# Altium footprint library DaughterBoard.PcbLib: 103 footprints (part 4 of 7)
Each footprint in its own frame and in the unit in brackets; x right, y up, seen from the top. Pads: shape width x height; smd on the part's side, far side on the other; paste and mask are expansions set on the pad; w line width, h text height; cw(c..) or ccw(c..) is an arc to the next point about the centre after c.
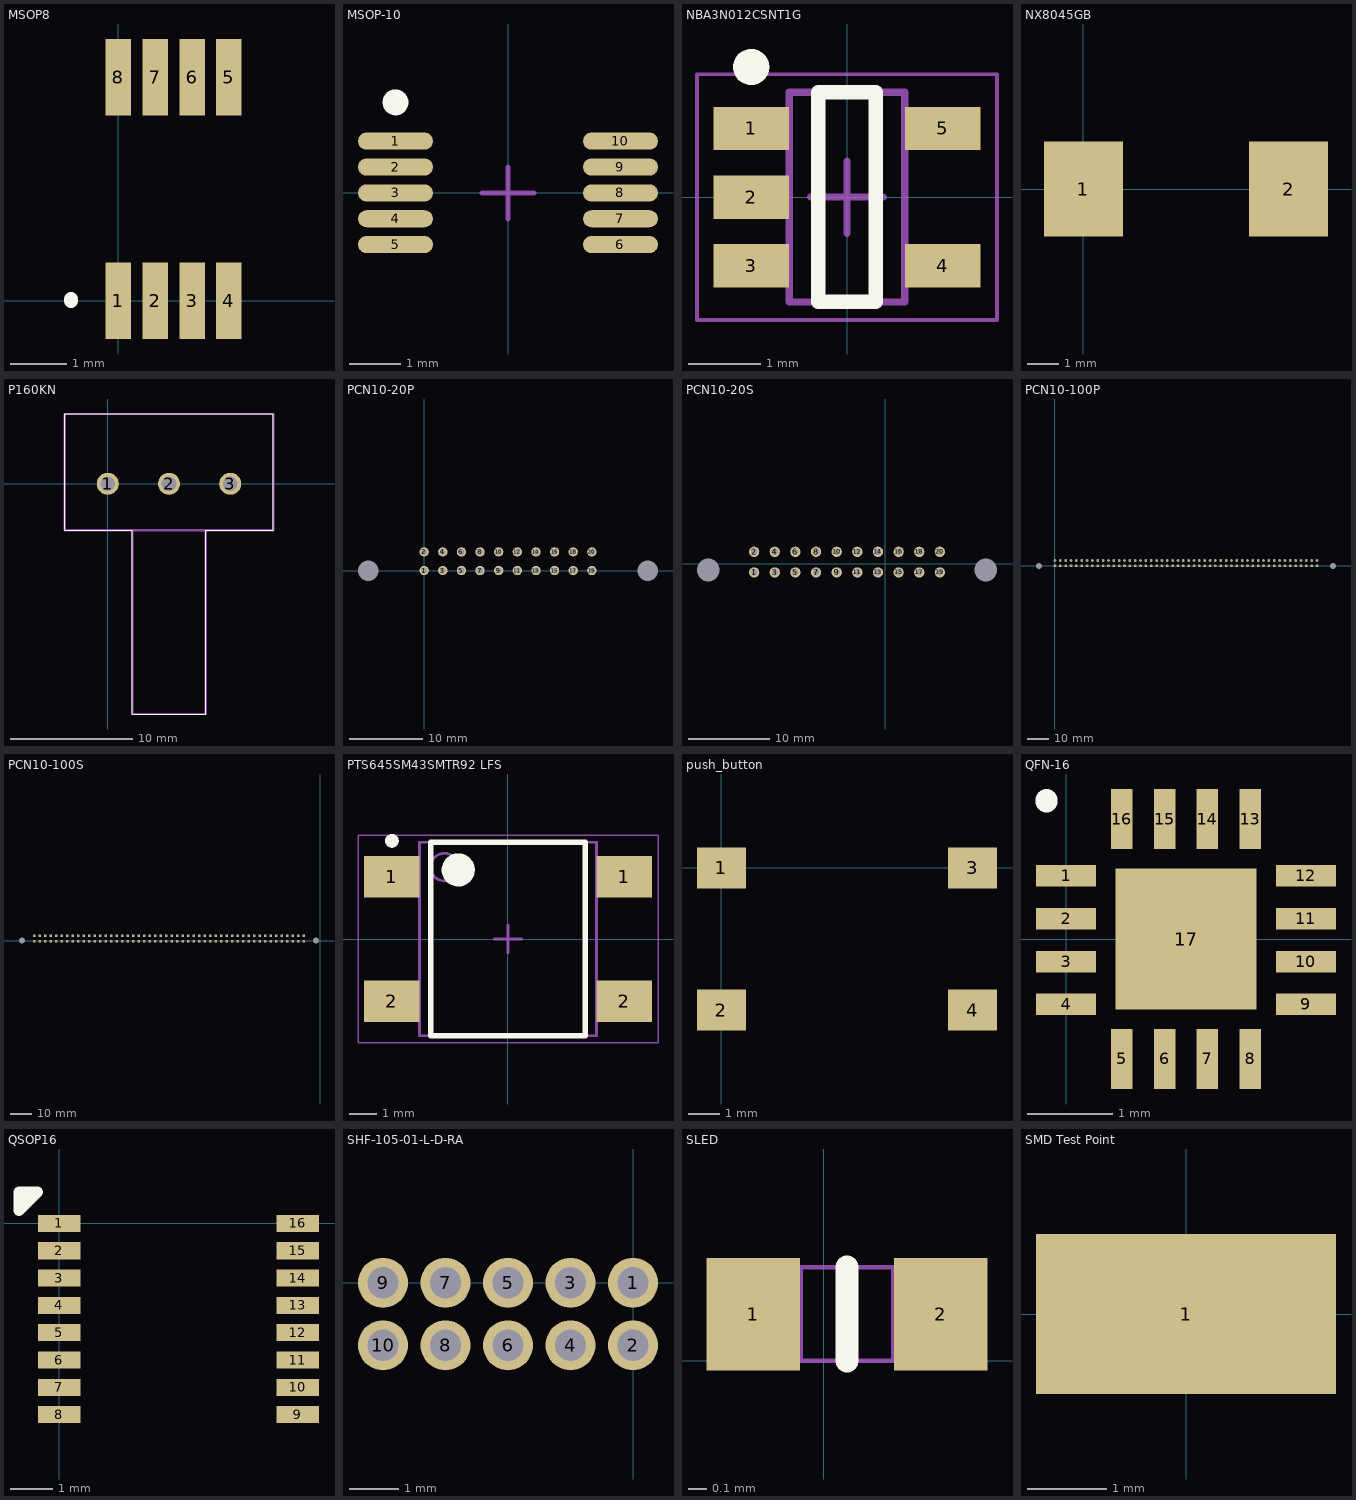
[diagram p3: the footprints below, top view; thin cyan lines are the x and y axes]

## MSOP8 [mm]
pads (8):
  rect 0.45x1.35 smd: 1(0,0) 2(0.65,0) 3(1.3,0) 4(1.95,0) 5(1.95,3.95) 6(1.3,3.95) 7(0.65,3.95) 8(0,3.95)
Top Overlay:
  lines w0.254: -0.838,0 -0.838,0.025
3D body "User Library-MSOP8-3.STEP": height 0.93, standoff -0.06, extent -0.509,-0.424 2.491,4.435

## MSOP-10 [mm]
height 1.1
pads (10):
  oval 1.45x0.33 smd: 1(-2.175,1) 2(-2.175,0.5) 3(-2.175,0) 4(-2.175,-0.5) 5(-2.175,-1) 6(2.175,-1) 7(2.175,-0.5) 8(2.175,0) 9(2.175,0.5) 10(2.175,1)
Top Overlay:
  circle w0.25: c-2.175,1.75 r0.125
Mechanical 15:
  lines w0.1: -0.5,0 0.5,0 ; 0,-0.5 0,0.5
3D body "MSOP-10.step": height 1.1, standoff 0, extent -2.45,-1.45 2.45,1.45

## NBA3N012CSNT1G [mm] "SOT23, 5-Leads, Body 2.90x2.80mm, Pitch 0.95mm, IPC Medium Density"
height 1.45
pads (5):
  rect 1.05x0.6 smd: 1(-1.325,0.95) 2(-1.325,0) 3(-1.325,-0.95) 4(1.325,-0.95) 5(1.325,0.95)
Top Overlay:
  circle w0.25: c-1.325,1.8 r0.125
  lines w0.2: -0.4,-1.45 -0.4,1.45 0.4,1.45 0.4,-1.45 -0.4,-1.45
Mechanical 13:
  lines w0.1: -0.8,-1.45 0.8,-1.45 0.8,1.45 -0.8,1.45 -0.8,-1.45
Mechanical 15:
  lines w0.05: -2.075,-1.7 2.075,-1.7 2.075,1.7 -2.075,1.7 -2.075,-1.7
  lines w0.1: -0.5,0 0.5,0 ; 0,-0.5 0,0.5
3D body "NBA3N012CSNT1G.step": height 1.45, standoff 0, extent -1.4,-1.45 1.4,1.45

## NX8045GB [mm]
pads (2):
  rect 2.5x3 smd: 1(0,0) 2(6.5,0)
3D body "User Library-cry_8045.step": height 1.8, standoff 0, extent -0.78,-2.2 7.22,2.3

## P160KN [mm]
pads (3):
  round 1.8 hole 1.2: 1(0,0) 2(5,0) 3(10,0)
Top Overlay:
  lines w0.1: -3.5,-3.8 2,-3.8 2,-18.8 8,-18.8 8,-3.8 13.5,-3.8 13.5,5.7 -3.5,5.7 -3.5,-3.8
Mechanical 13:
  lines w0.2: -3.5,-3.8 13.5,-3.8 13.5,5.7 -3.5,5.7 -3.5,-3.8 ; 2,-18.8 8,-18.8 8,-3.8 2,-3.8 2,-18.8

## PCN10-20P [mil]
pads (22):
  round 50 hole 31.5: 1(0,0) 2(0,100) 3(100,0) 4(100,100) 5(200,0) 6(200,100) 7(300,0) 8(300,100) 9(400,0) 10(400,100) 11(500,0) 12(500,100) 13(600,0) 14(600,100) 15(700,0) 16(700,100) 17(800,0) 18(800,100) 19(900,0) 20(900,100)
  round 60 hole 110: ""(-300,0) ""(1200,0)
3D body "PCN10-20P-2.54DSA.stp": height 456.69, standoff -125.98, extent -405,-119.29 1299.72,219.29

## PCN10-20S [mil]
pads (22):
  round 50 hole 31.5: 1(-635,-42) 2(-635,58) 3(-535,-42) 4(-535,58) 5(-435,-42) 6(-435,58) 7(-335,-42) 8(-335,58) 9(-235,-42) 10(-235,58) 11(-135,-42) 12(-135,58) 13(-35,-42) 14(-35,58) 15(65,-42) 16(65,58) 17(165,-42) 18(165,58) 19(265,-42) 20(265,58)
  round 60 hole 110: ""(-856.65,-30.19) ""(486.65,-30.19)
3D body "PCN10C-20S-2.54DSA.stp": height 452.76, standoff -153.54, extent -956,-149.45 584.16,169.45

## PCN10-100P [mil]
pads (102):
  round 50 hole 31.5: 1(0,0) 2(0,100) 3(100,0) 4(100,100) 5(200,0) 6(200,100) 7(300,0) 8(300,100) 9(400,0) 10(400,100) 11(500,0) 12(500,100) 13(600,0) 14(600,100) 15(700,0) 16(700,100) 17(800,0) 18(800,100) 19(900,0) 20(900,100) 21(1000,0) 22(1000,100) 23(1100,0) 24(1100,100) 25(1200,0) 26(1200,100) 27(1300,0) 28(1300,100) 29(1400,0) 30(1400,100) 31(1500,0) 32(1500,100) 33(1600,0) 34(1600,100) 35(1700,0) 36(1700,100) 37(1800,0) 38(1800,100) 39(1900,0) 40(1900,100) 41(2000,0) 42(2000,100) 43(2100,0) 44(2100,100) 45(2200,0) 46(2200,100) 47(2300,0) 48(2300,100) 49(2400,0) 50(2400,100) 51(2500,0) 52(2500,100) 53(2600,0) 54(2600,100) 55(2700,0) 56(2700,100) 57(2800,0) 58(2800,100) 59(2900,0) 60(2900,100) 61(3000,0) 62(3000,100) 63(3100,0) 64(3100,100) 65(3200,0) 66(3200,100) 67(3300,0) 68(3300,100) 69(3400,0) 70(3400,100) 71(3500,0) 72(3500,100) 73(3600,0) 74(3600,100) 75(3700,0) 76(3700,100) 77(3800,0) 78(3800,100) 79(3900,0) 80(3900,100) 81(4000,0) 82(4000,100) 83(4100,0) 84(4100,100) 85(4200,0) 86(4200,100) 87(4300,0) 88(4300,100) 89(4400,0) 90(4400,100) 91(4500,0) 92(4500,100) 93(4600,0) 94(4600,100) 95(4700,0) 96(4700,100) 97(4800,0) 98(4800,100) 99(4900,0) 100(4900,100)
  round 60 hole 110: ""(-300,0) ""(5200,0)
3D body "PCN10-100P-2.54DSA.stp": height 456.69, standoff -125.98, extent -402,-119.29 5302.72,219.29

## PCN10-100S [mil]
pads (102):
  round 50 hole 31.5: 1(-5200,-13.62) 2(-5200,88.38) 3(-5100,-13.62) 4(-5100,88.38) 5(-5000,-13.62) 6(-5000,88.38) 7(-4900,-13.62) 8(-4900,88.38) 9(-4800,-13.62) 10(-4800,88.38) 11(-4700,-13.62) 12(-4700,88.38) 13(-4600,-13.62) 14(-4600,88.38) 15(-4500,-13.62) 16(-4500,88.38) 17(-4400,-13.62) 18(-4400,88.38) 19(-4300,-13.62) 20(-4300,88.38) 21(-4200,-13.62) 22(-4200,88.38) 23(-4100,-13.62) 24(-4100,88.38) 25(-4000,-13.62) 26(-4000,88.38) 27(-3900,-13.62) 28(-3900,88.38) 29(-3800,-13.62) 30(-3800,88.38) 31(-3700,-13.62) 32(-3700,88.38) 33(-3600,-13.62) 34(-3600,88.38) 35(-3500,-13.62) 36(-3500,88.38) 37(-3400,-13.62) 38(-3400,88.38) 39(-3300,-13.62) 40(-3300,88.38) 41(-3200,-13.62) 42(-3200,88.38) 43(-3100,-13.62) 44(-3100,88.38) 45(-3000,-13.62) 46(-3000,88.38) 47(-2900,-13.62) 48(-2900,88.38) 49(-2800,-13.62) 50(-2800,88.38) 51(-2700,-13.62) 52(-2700,88.38) 53(-2600,-13.62) 54(-2600,88.38) 55(-2500,-13.62) 56(-2500,88.38) 57(-2400,-13.62) 58(-2400,88.38) 59(-2300,-13.62) 60(-2300,88.38) 61(-2200,-13.62) 62(-2200,88.38) 63(-2100,-13.62) 64(-2100,88.38) 65(-2000,-13.62) 66(-2000,88.38) 67(-1900,-13.62) 68(-1900,88.38) 69(-1800,-13.62) 70(-1800,88.38) 71(-1700,-13.62) 72(-1700,88.38) 73(-1600,-13.62) 74(-1600,88.38) 75(-1500,-13.62) 76(-1500,88.38) 77(-1400,-13.62) 78(-1400,88.38) 79(-1300,-13.62) 80(-1300,88.38) 81(-1200,-13.62) 82(-1200,88.38) 83(-1100,-13.62) 84(-1100,88.38) 85(-1000,-13.62) 86(-1000,88.38) 87(-900,-13.62) 88(-900,88.38) 89(-800,-13.62) 90(-800,88.38) 91(-700,-13.62) 92(-700,88.38) 93(-600,-13.62) 94(-600,88.38) 95(-500,-13.62) 96(-500,88.38) 97(-400,-13.62) 98(-400,88.38) 99(-300,-13.62) 100(-300,88.38)
  round 60 hole 110: ""(-5421.65,0) ""(-78.35,0)
3D body "PCN10MC-100S-2.54DSA.stp": height 492.13, standoff -153.54, extent -5520.16,-123 20,195.9

## PTS645SM43SMTR92 LFS [mm]
height 4.3
pads (4):
  rect 2x1.5 smd: 1(-4.2,2.25) 1(4.2,2.25) 2(-4.2,-2.25) 2(4.2,-2.25)
Top Overlay:
  circle w0.25: c-4.2,3.55 r0.125
  circle w0.6: c-1.8,2.5 r0.3
  lines w0.2: -2.8,-3.5 -2.8,3.5 2.8,3.5 2.8,-3.5 -2.8,-3.5
Mechanical 13:
  circle w0.1: c-2.3,2.6 r0.5
  lines w0.1: -3.2,-3.5 -3.2,3.5 3.2,3.5 3.2,-3.5 -3.2,-3.5
Mechanical 15:
  lines w0.05: -5.425,-3.75 -5.425,3.75 5.425,3.75 5.425,-3.75 -5.425,-3.75
  lines w0.1: -0.5,0 0.5,0 ; 0,-0.5 0,0.5
3D body "PTS645SM43SMTR92 LFS.step": height 4.3, standoff 0, extent -4.743,-3.5 4.743,3.5

## push_button [mm]
pads (4):
  rect 1.55x1.3 smd: 1(0,0) 2(0,-4.5) 3(7.95,0) 4(7.95,-4.5)
3D body "430182043816 (rev1) (1).stp": height 4.3, standoff 0, extent -0.487,-5.31 8.513,0.89

## QFN-16 [mm]
pads (17):
  rect 0.7x0.25 smd: 1(0,0.737) 2(0,0.237) 3(0,-0.263) 4(0,-0.763) 9(2.8,-0.763) 10(2.8,-0.263) 11(2.8,0.237) 12(2.8,0.737)
  rect 0.25x0.7 smd: 5(0.65,-1.4) 6(1.15,-1.4) 7(1.65,-1.4) 8(2.15,-1.4) 13(2.15,1.4) 14(1.65,1.4) 15(1.15,1.4) 16(0.65,1.4)
  rect 1.65x1.65 smd: 17(1.4,0)
Top Overlay:
  lines w0.254: -0.229,1.6 -0.229,1.626
3D body "User Library-QFN-16_3x3.STEP": height 0.9, standoff 0, extent -0.127,-1.543 2.915,1.499

## QSOP16 [mm]
pads (16):
  rect 1x0.4 smd: 1(0,0) 2(0,-0.64) 3(0,-1.28) 4(0,-1.92) 5(0,-2.56) 6(0,-3.2) 7(0,-3.84) 8(0,-4.48) 9(5.588,-4.48) 10(5.588,-3.84) 11(5.588,-3.2) 12(5.588,-2.56) 13(5.588,-1.92) 14(5.588,-1.28) 15(5.588,-0.64) 16(5.588,0)
Top Overlay:
  lines w0.254: -0.94,0.305 -0.508,0.737 -0.94,0.737 -0.94,0.305
3D body "User Library-MAX_QSOP16.step": height 1.73, standoff -0.05, extent -0.241,-4.725 5.779,0.255

## SHF-105-01-L-D-RA [mil]
pads (10):
  round 40 hole 25: 1(0,0) 2(0,-50) 3(-50,0) 4(-50,-50) 5(-100,0) 6(-100,-50) 7(-150,0) 8(-150,-50) 9(-200,0) 10(-200,-50)
3D body "SHF-105-01-L-D-RA.stp": height 220, standoff -85, extent -350,-310 150,8

## SLED [mil]
pads (2):
  rect 20x24 smd: 1(-15,10) 2(25,10)
Top Overlay:
  lines w5: 5,0 5,20
Mechanical 1:
  lines w1: -15,0 -15,20 -8.94,20 24.68,20 24.68,0 -14.69,0 ; -4.84,0 -4.84,20 ; 14.84,0 14.84,20
3D body: height 18, standoff 0, extent -15,0 -5,20
3D body: height 18, standoff 0, extent 15,0 24.68,20
3D body: height 18, standoff 0, extent -5,0 15,20

## SMD Test Point [mm]
pads (1):
  rect 3.8x2.03 smd: 1(0,0)
3D body: height 1.5, standoff -1.5, extent -0.127,0.127 -0.127,0.127
3D body "User Library-User Library-Keystone_5019.STEP": height 2.29, standoff 0, extent -1.905,-1.015 1.905,1.015